# Altium footprint library TarabusLibrary.PcbLib: 591 footprints (part 22 of 37)
Each footprint in its own frame and in the unit in brackets; x right, y up, seen from the top. Pads: shape width x height; smd on the part's side, far side on the other; paste and mask are expansions set on the pad; w line width, h text height; cw(c..) or ccw(c..) is an arc to the next point about the centre after c.
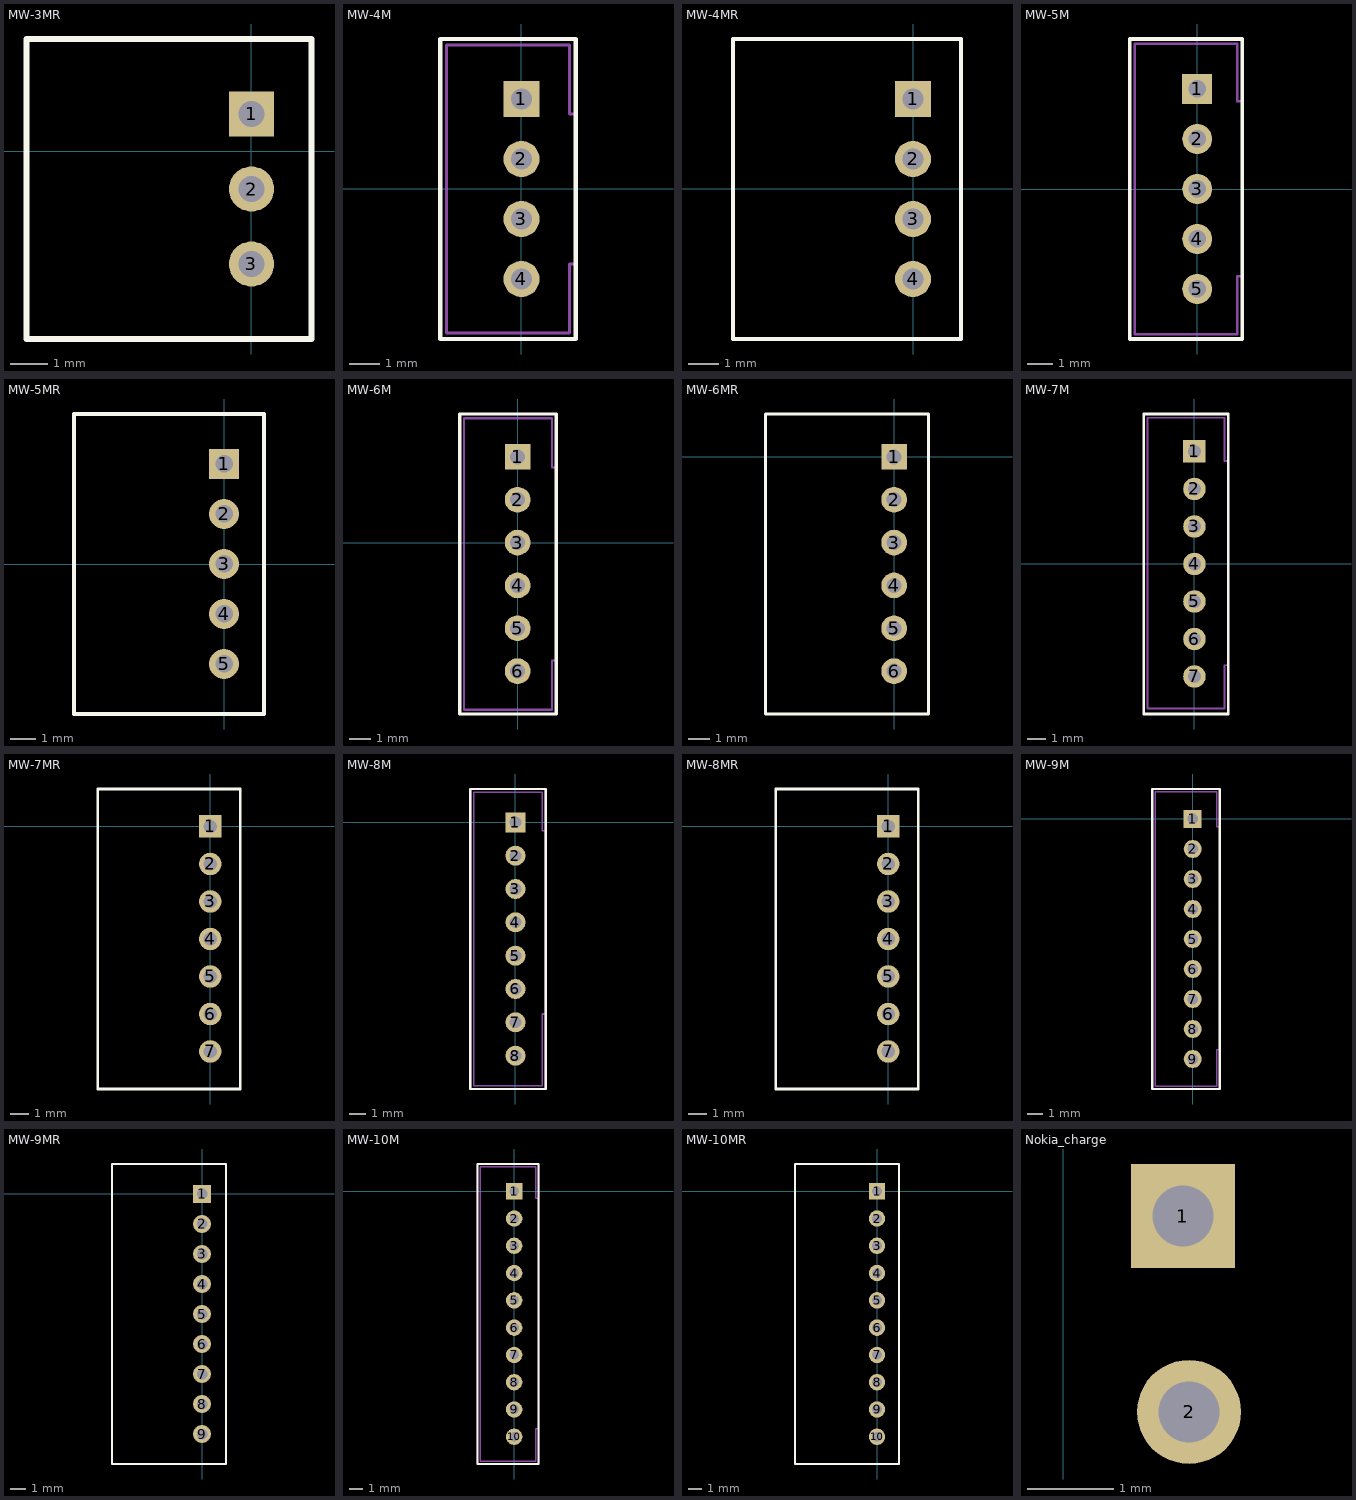
[diagram p21: the footprints below, top view; thin cyan lines are the x and y axes]

## MW-3MR [mm]
pads (3):
  rect 1.2x1.2 hole 0.7: 1(0,1)
  round 1.2 hole 0.7: 2(0,-1) 3(0,-3)
Top Overlay:
  lines w0.15: -6,-5 1.6,-5 1.6,3 -6,3 -6,-5
Mechanical 7:
  lines w0.1: -6,-5 -6,3 1.6,3 1.6,-5 -6,-5
Mechanical 10:
  text ".Comment" at -3.42,3.43 h0.6
  text ".Designator" at -3.43,4 h0.8
3D body "S3B-PH-K-S.STEP": height 4.8, standoff -3.4, extent -6,-4.95 1.6,2.95

## MW-4M [mm]
height 6
pads (4):
  rect 1.2x1.2 hole 0.7: 1(0,3)
  round 1.2 hole 0.7: 2(0,1) 3(0,-1) 4(0,-3)
Top Overlay:
  lines w0.15: -2.7,-5 1.8,-5 1.8,5 -2.7,5 -2.7,-5
Mechanical 7:
  lines w0.1: 1.79,-2.5 1.6,-2.5 1.6,-4.8 -2.5,-4.8 -2.5,4.8 1.6,4.8 1.6,2.5 1.79,2.5 ; -2.7,-5 1.8,-5 1.8,5 -2.7,5 -2.7,-5
Mechanical 10:
  text ".Comment" at -1.27,5.41 h0.6
  text ".Designator" at -1.28,5.98 h0.8
3D body: height 6, standoff 0, extent -2.7,-5 1.8,5

## MW-4MR [mm]
height 4.5
pads (4):
  rect 1.2x1.2 hole 0.7: 1(0,3)
  round 1.2 hole 0.7: 2(0,1) 3(0,-1) 4(0,-3)
Top Overlay:
  lines w0.15: -6,-5 1.6,-5 1.6,5 -6,5 -6,-5
Mechanical 7:
  lines w0.1: -6,-5 -6,5 1.6,5 1.6,-5 -6,-5
Mechanical 10:
  text ".Comment" at -3.42,5.46 h0.6
  text ".Designator" at -3.43,6.03 h0.8
3D body: height 4.5, standoff 0, extent -6,-5 1.6,5

## MW-5M [mm]
height 6
pads (5):
  rect 1.2x1.2 hole 0.7: 1(0,4)
  round 1.2 hole 0.7: 2(0,2) 3(0,0) 4(0,-2) 5(0,-4)
Top Overlay:
  lines w0.15: -2.7,-6 -2.7,6 1.8,6 1.8,-6 -2.7,-6
Mechanical 7:
  lines w0.1: 1.79,-3.5 1.6,-3.5 1.6,-5.8 -2.5,-5.8 -2.5,5.8 1.6,5.8 1.6,3.5 1.79,3.5 ; -2.7,-6 -2.7,6 1.8,6 1.8,-6 -2.7,-6
Mechanical 10:
  text ".Designator" at -1.28,6.98 h0.8
  text ".Comment" at -1.27,6.41 h0.6
3D body: height 6, standoff 0, extent -2.7,-6 1.8,6

## MW-5MR [mm]
height 4.5
pads (5):
  rect 1.2x1.2 hole 0.7: 1(0,4)
  round 1.2 hole 0.7: 2(0,2) 3(0,0) 4(0,-2) 5(0,-4)
Top Overlay:
  lines w0.15: -6,-6 1.6,-6 1.6,6 -6,6 -6,-6
Mechanical 7:
  lines w0.1: -6,-6 1.6,-6 1.6,6 -6,6 -6,-6
Mechanical 10:
  text ".Designator" at -3.43,7.03 h0.8
  text ".Comment" at -3.42,6.46 h0.6
3D body: height 4.5, standoff 0, extent -6,-6 1.6,6

## MW-6M [mm]
height 6
pads (6):
  rect 1.2x1.2 hole 0.7: 1(0,4)
  round 1.2 hole 0.7: 2(0,2) 3(0,0) 4(0,-2) 5(0,-4) 6(0,-6)
Top Overlay:
  lines w0.15: -2.7,-8 -2.7,6 1.8,6 1.8,-8 -2.7,-8
Mechanical 7:
  lines w0.1: 1.79,-5.5 1.6,-5.5 1.6,-7.8 -2.5,-7.8 -2.5,5.8 1.6,5.8 1.6,3.5 1.79,3.5 ; -2.7,-8 -2.7,6 1.8,6 1.8,-8 -2.7,-8
Mechanical 10:
  text ".Designator" at -1.28,6.98 h0.8
  text ".Comment" at -1.27,6.41 h0.6
3D body: height 6, standoff 0, extent -2.7,-8 1.8,6

## MW-6MR [mm]
height 4.5
pads (7):
  rect 1.2x1.2 hole 0.7: 1(0,0)
  round 1.2 hole 0.7: 2(0,-2) 3(0,-4) 4(0,-6) 5(0,-8) 5(0,-8) 6(0,-10)
Top Overlay:
  lines w0.15: -6,-12 -6,2 1.6,2 1.6,-12 -6,-12
Mechanical 7:
  lines w0.1: -6,-12 -6,2 1.6,2 1.6,-12 -6,-12
Mechanical 10:
  text ".Comment" at -3.42,2.46 h0.6
  text ".Designator" at -3.43,3.03 h0.8
3D body: height 4.5, standoff 0, extent -6,-12 1.6,2

## MW-7M [mm]
height 6
pads (7):
  rect 1.2x1.2 hole 0.7: 1(0,6)
  round 1.2 hole 0.7: 2(0,4) 3(0,2) 4(0,0) 5(0,-2) 6(0,-4) 7(0,-6)
Top Overlay:
  lines w0.15: -2.7,-8 1.8,-8 1.8,8 -2.7,8 -2.7,-8
Mechanical 7:
  lines w0.1: 1.79,-5.4 1.6,-5.4 1.6,-7.7 -2.5,-7.7 -2.5,7.8 1.6,7.8 1.6,5.5 1.79,5.5 ; -2.7,-8 1.8,-8 1.8,8 -2.7,8 -2.7,-8
Mechanical 10:
  text ".Comment" at -1.27,8.41 h0.6
  text ".Designator" at -1.28,8.98 h0.8
3D body: height 6, standoff 0, extent -2.7,-8 1.8,8

## MW-7MR [mm]
height 4.5
pads (7):
  rect 1.2x1.2 hole 0.7: 1(0,0)
  round 1.2 hole 0.7: 2(0,-2) 3(0,-4) 4(0,-6) 5(0,-8) 6(0,-10) 7(0,-12)
Top Overlay:
  lines w0.15: -6,-14 -6,2 1.6,2 1.6,-14 -6,-14
Mechanical 7:
  lines w0.1: -6,-14 -6,2 1.6,2 1.6,-14 -6,-14
Mechanical 10:
  text ".Comment" at -3.42,2.46 h0.6
  text ".Designator" at -3.43,3.03 h0.8
3D body: height 4.5, standoff 0, extent -6,-14 1.6,2

## MW-8M [mm]
pads (8):
  rect 1.2x1.2 hole 0.7: 1(0,0)
  round 1.2 hole 0.7: 2(0,-2) 3(0,-4) 4(0,-6) 5(0,-8) 6(0,-10) 7(0,-12) 8(0,-14)
Top Overlay:
  lines w0.15: -2.7,-16 1.8,-16 1.8,2 -2.7,2 -2.7,-16
Mechanical 7:
  lines w0.1: 1.79,-11.5 1.6,-11.5 1.6,-15.8 -2.5,-15.8 -2.5,1.8 1.6,1.8 1.6,-0.5 1.79,-0.5 ; -2.7,-16 1.8,-16 1.8,2 -2.7,2 -2.7,-16
Mechanical 10:
  text ".Comment" at -1.27,2.41 h0.6
  text ".Designator" at -1.28,2.98 h0.8
3D body "MW-8M.STEP": height 6, standoff -3, extent -2.8,-15.975 1.7,1.925

## MW-8MR [mm]
height 4.5
pads (7):
  rect 1.2x1.2 hole 0.7: 1(0,0)
  round 1.2 hole 0.7: 2(0,-2) 3(0,-4) 4(0,-6) 5(0,-8) 6(0,-10) 7(0,-12)
Top Overlay:
  lines w0.15: -6,-14 -6,2 1.6,2 1.6,-14 -6,-14
Mechanical 7:
  lines w0.1: -6,-14 -6,2 1.6,2 1.6,-14 -6,-14
Mechanical 10:
  text ".Comment" at -3.42,2.46 h0.6
  text ".Designator" at -3.43,3.03 h0.8
3D body: height 4.5, standoff 0, extent -6,-14 1.6,2

## MW-9M [mm]
pads (9):
  rect 1.2x1.2 hole 0.7: 1(0,0)
  round 1.2 hole 0.7: 2(0,-2) 3(0,-4) 4(0,-6) 5(0,-8) 6(0,-10) 7(0,-12) 8(0,-14) 9(0,-16)
Top Overlay:
  lines w0.15: -2.7,-18 -2.7,2 1.8,2 1.8,-18 -2.7,-18
Mechanical 7:
  lines w0.1: 1.79,-15.4 1.6,-15.4 1.6,-17.8 -2.5,-17.8 -2.5,1.8 1.6,1.8 1.6,-0.5 1.79,-0.5 ; -2.7,-18 -2.7,2 1.8,2 1.8,-18 -2.7,-18
Mechanical 10:
  text ".Designator" at -1.28,2.98 h0.8
  text ".Comment" at -1.27,2.41 h0.6

## MW-9MR [mm]
height 4.5
pads (9):
  rect 1.2x1.2 hole 0.7: 1(0,0)
  round 1.2 hole 0.7: 2(0,-2) 3(0,-4) 4(0,-6) 5(0,-8) 6(0,-10) 7(0,-12) 8(0,-14) 9(0,-16)
Top Overlay:
  lines w0.15: -6,-18 1.6,-18 1.6,2 -6,2 -6,-18
Mechanical 7:
  lines w0.1: -6,-18 1.6,-18 1.6,2 -6,2 -6,-18
Mechanical 10:
  text ".Designator" at -3.43,3.03 h0.8
  text ".Comment" at -3.42,2.46 h0.6
3D body: height 4.5, standoff 0, extent -6,-18 1.6,2

## MW-10M [mm]
pads (10):
  rect 1.2x1.2 hole 0.7: 1(0,0)
  round 1.2 hole 0.7: 2(0,-2) 3(0,-4) 4(0,-6) 5(0,-8) 6(0,-10) 7(0,-12) 8(0,-14) 9(0,-16) 10(0,-18)
Top Overlay:
  lines w0.15: -2.7,-20 1.8,-20 1.8,2 -2.7,2 -2.7,-20
Mechanical 7:
  lines w0.1: 1.79,-17.4 1.6,-17.4 1.6,-19.8 -2.5,-19.8 -2.5,1.8 1.6,1.8 1.6,-0.5 1.79,-0.5 ; -2.7,-20 1.8,-20 1.8,2 -2.7,2 -2.7,-20
Mechanical 10:
  text ".Comment" at -1.27,2.41 h0.6
  text ".Designator" at -1.28,2.98 h0.8

## MW-10MR [mm]
height 4.5
pads (10):
  rect 1.2x1.2 hole 0.7: 1(0,0)
  round 1.2 hole 0.7: 2(0,-2) 3(0,-4) 4(0,-6) 5(0,-8) 6(0,-10) 7(0,-12) 8(0,-14) 9(0,-16) 10(0,-18)
Top Overlay:
  lines w0.15: -6,-20 -6,2 1.6,2 1.6,-20 -6,-20
Mechanical 7:
  lines w0.1: -6,-20 -6,2 1.6,2 1.6,-20 -6,-20
Mechanical 10:
  text ".Comment" at -3.42,2.46 h0.6
  text ".Designator" at -3.43,3.03 h0.8
3D body: height 4.5, standoff 0, extent -6,-20 1.6,2

## Nokia_charge [mm]
pads (2):
  rect 1.2x1.2 hole 0.7: 1(1.38,-1.48)
  round 1.2 hole 0.7: 2(1.45,-3.74)
3D body "nokia.STEP": height 3.7, standoff 0.1, extent 0,-5.2 6.9,0